# Altium integrated library Mastermind.IntLib: 985 symbols (part 2 of 6) (continued)
## Header 5X2_TE-CON (continued)
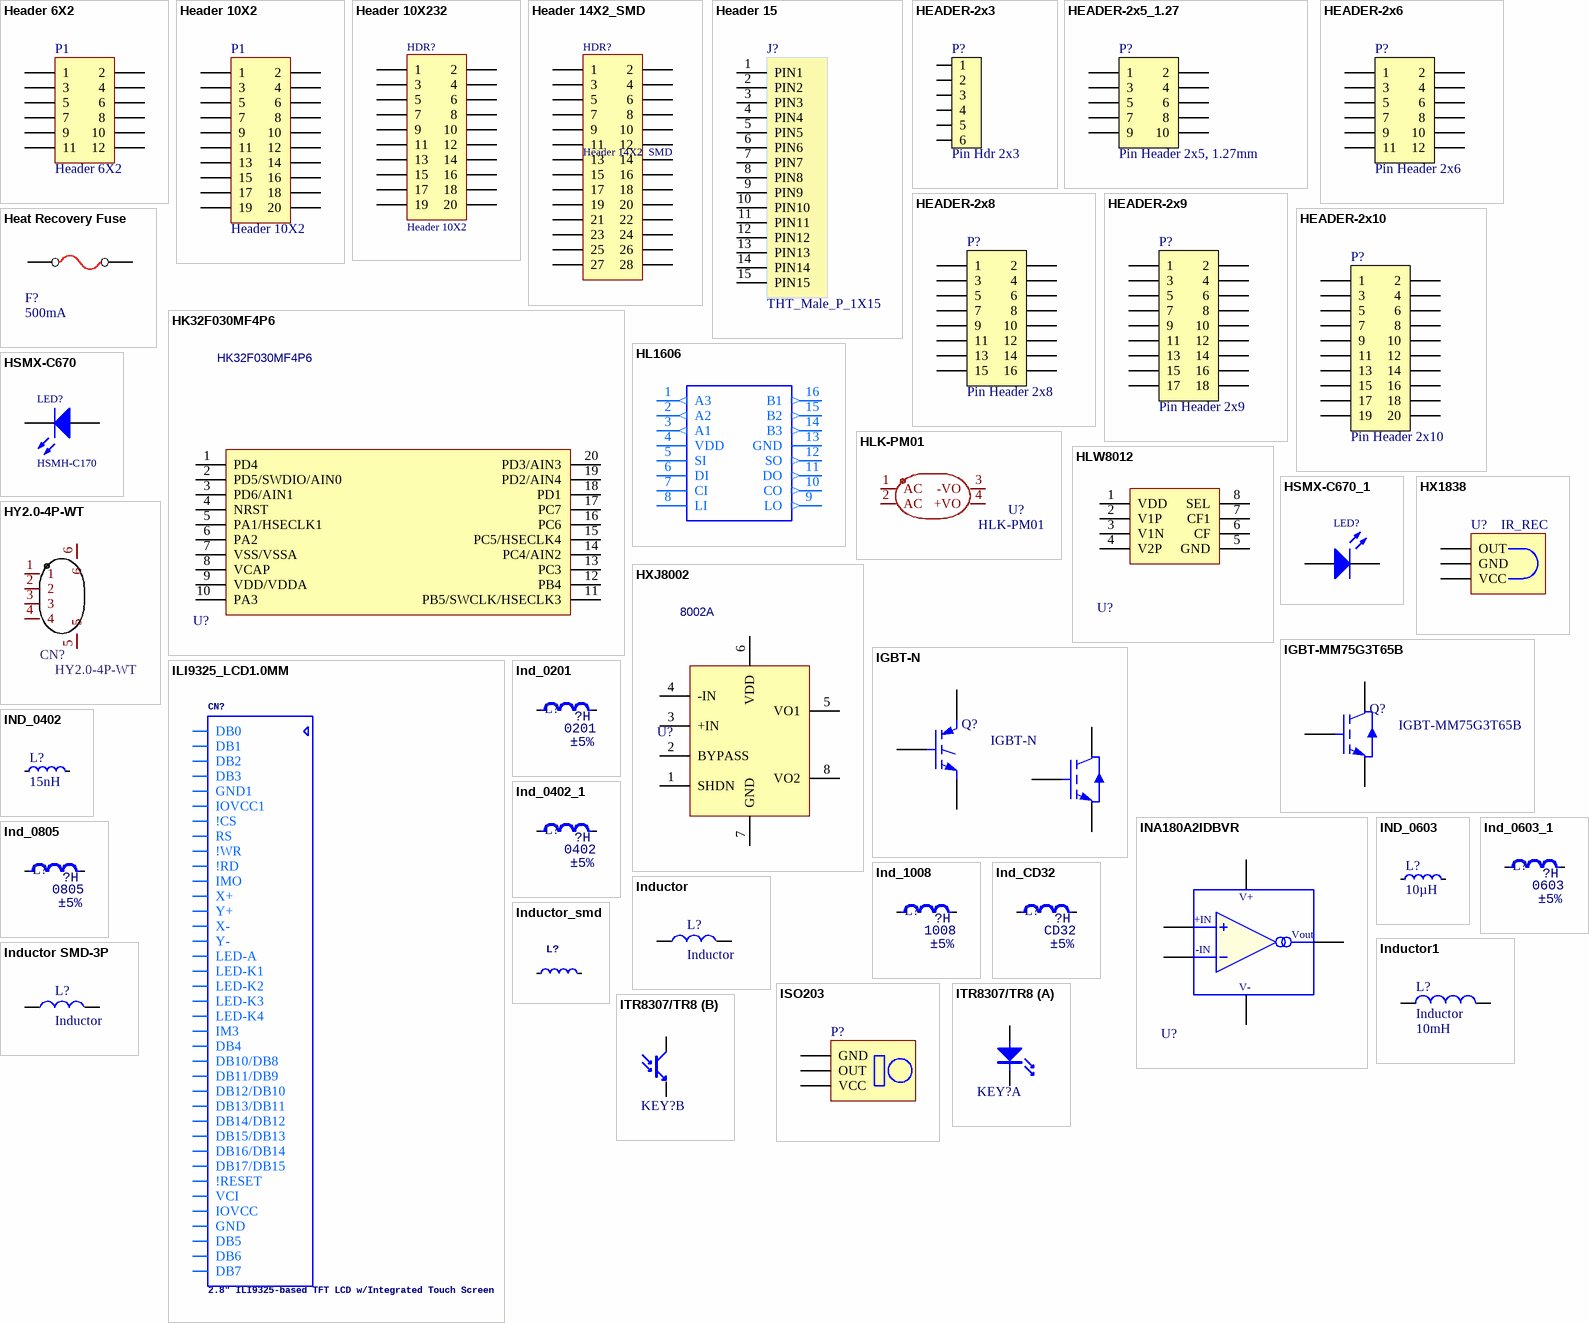
[diagram p14: symbols Header 6X2 to ITR8307/TR8]

## Header 6X2
designator P1
Header, 6-Pin, Dual row; LatestRevisionDate: 17-Jul-2002; LatestRevisionNote: Re-released for DXP Platform.; Publisher: Altium Limited
footprint HDR2X6 (Connector; Header; 6x2 Position)
signal-integrity model Connector
footprint DIP12_2sided
footprint HDR_2x6 - SMD - 2.0
footprint HDR_2x6 - SMD - 2.54
footprint HDR2X6_2mm (Connector; Header; 6x2 Position)
pins: 1, 2, 3, 4, 5, 6, 7, 8, 9, 10, 11, 12

## Header 10X2
designator P1
Header, 10-Pin, Dual row; LatestRevisionDate: 17-Jul-2002; LatestRevisionNote: Re-released for DXP Platform.; Publisher: Altium Limited
footprint HDR2X10
signal-integrity model Connector
pins: 1, 2, 3, 4, 5, 6, 7, 8, 9, 10, 11, 12, 13, 14, 15, 16, 17, 18, 19, 20

## Header 10X232
designator HDR?, comment Header 10X2
Header, 10-Pin, Dual row; Revision: July-2002: Re-released for DXP Platform.
footprint HDR2X10
signal-integrity model Connector
3D model HDR10X2 (PCB3D Model)
pins: 1, 2, 3, 4, 5, 6, 7, 8, 9, 10, 11, 12, 13, 14, 15, 16, 17, 18, 19, 20

## Header 14X2_SMD
designator HDR?, comment Header 14X2  SMD
Header, 5-Pin, Dual row; Revision: 17-Jul-2002: Re-released for DXP Platform.
signal-integrity model Connector
3D model 10_pin_box_male (PCB3D Model)
footprint DIP28_2SIDED
pins: 1, 2, 3, 4, 5, 6, 7, 8, 9, 10, 11, 12, 13, 14, 15, 16, 17, 18, 19, 20, 21, 22, 23, 24, 25, 26, 27, 28

## Header 15
designator J?  Name: THT_Male_P_1X15
Header, 15-Pin; LatestRevisionDate: 17-Jul-2002; LatestRevisionNote: Re-released for DXP Platform.; Publisher: Altium Limited
footprint HDR1X15 (Connector; Header; 15 Position)
signal-integrity model Connector
pins: 1 PIN1, 2 PIN2, 3 PIN3, 4 PIN4, 5 PIN5, 6 PIN6, 7 PIN7, 8 PIN8, 9 PIN9, 10 PIN10, 11 PIN11, 12 PIN12, 13 PIN13, 14 PIN14, 15 PIN15

## HEADER-2x3
designator P?, comment Pin Hdr 2x3
Pin Header 2x3, 2.54mm (100mil) SMD; Part Number: Pin Header 2x3 SMD; Manufacturer: WCON; Manufacturer Part Number: 1125-1203S0M116R1; 2nd source part number: TSM-103-01-L-DV; Artikkelnr Noca: 55010007; Artikkelnr Simpro: N.A.; Datasheet: \\hizz\pro\app9717\Datasheet\connectores\W-CON\1125-12XXXXMXXXXX.PDF; Footprint Doc: HDR_2x3-SMD; LatestRevisionDate: 2016-01-22; Pin Count: 6; Publisher: Nordic Semiconductor; Published: 2016-01-22; Value: Pin Hdr 2x3; Note: SMD; Supplier: Cabcon; Supplier part number: 1125-1203S0M116R1; 2nd source Supplier: Samtec
footprint HDR_2x3-SMD
pins: 1, 2, 3, 4, 5, 6

## HEADER-2x5_1.27
designator P?, comment Pin Header 2x5, 1.27mm
Pin Header 2x5, 1.27mm (50mil), SMD, Keying Shroud; Part Number: Pin Header 2x5 SMD, 1.27mm, KS; Manufacturer: WCON; Manufacturer Part Number: 3132-10MS0BK00R1; 2nd source part number: FTSH-105-01-F-DV-K; Artikkelnr Noca: 55010009; Artikkelnr Simpro: N.A.; Datasheet: \\hizz\pro\app9717\Datasheet\connectores\W-CON\3132-XXMXXBK00XX.pdf; Footprint Doc: HDR_2x5-SMD-1.27mm; LatestRevisionDate: 2016-04-21; Pin Count: 10; Publisher: Nordic Semiconductor; Published: 2016-01-22; Value: Pin Header 2x5, 1.27mm; Note: *; Supplier: Cabcon; Supplier part number: 3132-10MS0BK00R1; 2nd source Supplier: Samtec
footprint HDR_2x5-SMD-1.27mm-K
pins: 1, 2, 3, 4, 5, 6, 7, 8, 9, 10

## HEADER-2x6
designator P?, comment Pin Header 2x6
Pin Header 2x6, 2.54mm (100mil); Note: Not mounted; Artikkelnr Noca: N.A.; Part Number: Pin Header 2x6; Manufacturer: *; Manufacturer Part Number: *; Datasheet: *; Footprint Doc: HDR_2x6; LatestRevisionDate: 2014-07-04; Pin Count: 12; Publisher: Nordic Semiconductor; Published: 2009-12-12; Value: Pin Header 2x6; Supplier: *; Supplier part number: *; 2nd source Supplier: *; 2nd source part number: *; Artikkelnr Simpro: N.A.
footprint HDR_2x6
pins: 1, 2, 3, 4, 5, 6, 7, 8, 9, 10, 11, 12

## HEADER-2x8
designator P?, comment Pin Header 2x8
Pin Header 2x8, 2.54mm (100mil); Note: Not mounted; Artikkelnr Noca: N.A.; Part Number: Pin Header 2x8; Manufacturer: *; Manufacturer Part Number: *; Datasheet: *; Footprint Doc: HDR_2x8; LatestRevisionDate: 2009-12-12; Pin Count: 16; Publisher: Nordic Semiconductor; Published: 2009-12-12; Value: Pin Header 2x8; Supplier: *; Supplier part number: *; 2nd source Supplier: *; 2nd source part number: *; Artikkelnr Simpro: N.A.
footprint HDR_2x8
pins: 1, 2, 3, 4, 5, 6, 7, 8, 9, 10, 11, 12, 13, 14, 15, 16

## HEADER-2x9
designator P?, comment Pin Header 2x9
Pin Header 2x9, 2.54mm (100mil); Artikkelnr Noca: N.A.; Part Number: Pin Header 2x9; Manufacturer: *; Manufacturer Part Number: *; Datasheet: *; Footprint Doc: HDR_2x9; LatestRevisionDate: 2011-07-06; Pin Count: 18; Publisher: Nordic Semiconductor; Published: 2011-07-06; Value: Pin Header 2x9; Note: *; Supplier: *; Supplier part number: *; 2nd source Supplier: *; 2nd source part number: *; Artikkelnr Simpro: N.A.
footprint HDR_2x9
pins: 1, 2, 3, 4, 5, 6, 7, 8, 9, 10, 11, 12, 13, 14, 15, 16, 17, 18

## HEADER-2x10
designator P?, comment Pin Header 2x10
Pin Header 2x10, 2.54mm (100mil); Note: Not mounted; Artikkelnr Noca: N.A.; Part Number: Pin Header 2x10; Manufacturer: *; Manufacturer Part Number: *; Datasheet: *; Footprint Doc: HDR_2x10; LatestRevisionDate: 2014-07-04; Pin Count: 20; Publisher: Nordic Semiconductor; Published: 2009-12-12; Value: Pin Header 2x10; Supplier: *; Supplier part number: *; 2nd source Supplier: *; 2nd source part number: *; Artikkelnr Simpro: N.A.
footprint HDR_2x10
pins: 1, 2, 3, 4, 5, 6, 7, 8, 9, 10, 11, 12, 13, 14, 15, 16, 17, 18, 19, 20

## Heat Recovery Fuse
designator F?  value 500mA
footprint 0411V
footprint FUSE
footprint FUSE - Long
footprint 0207/2V
footprint Fuse-SMD
footprint 1812
footprint R1206-NO
pins: 1, 2

## HK32F030MF4P6
designator U?
Manufacturer: HK(航顺); Contributor: LCSC; Supplier: LCSC; Supplier Part: C707444; Manufacturer Part: HK32F030MF4P6; JLCPCB Part Class: Extended Part; spicePre: U; spiceSymbolName: HK32F030MF4P6
footprint TSSOP-20_L6.5-W4.4-P0.65-LS6.4-BL
pins: 1 PD4, 2 PD5/SWDIO/AIN0, 3 PD6/AIN1, 4 NRST, 5 PA1/HSECLK1, 6 PA2, 7 VSS/VSSA, 8 VCAP, 9 VDD/VDDA, 10 PA3, 11 PB5/SWCLK/HSECLK3, 12 PB4, 13 PC3, 14 PC4/AIN2, 15 PC5/HSECLK4, 16 PC6, 17 PC7, 18 PD1, 19 PD2/AIN4, 20 PD3/AIN3

## HL1606
designator ?
footprint SO16
pins: 1 A3 (out), 2 A2 (out), 3 A1 (out), 4 VDD (power), 5 SI, 6 DI, 7 CI, 8 LI, 9 LO (out), 10 CO (out), 11 DO (out), 12 SO (out), 13 GND (power), 14 B3 (out), 15 B2 (out), 16 B1 (out)

## HLK-PM01
designator U?
Manufacturer: HI-LINK(海凌科); Add into BOM: yes; Symbol: HLK-PM01; Device: HLK-PM01; LCSC Part Name: HLK-PM01; Supplier Part: C209903; Manufacturer Part: HLK-PM01; Supplier Footprint: 插件; JLCPCB Part Class: Extended Part; Datasheet: https://atta.szlcsc.com/upload/public/pdf/source/20220421/8C2E290B3E1C64DAE99DB0B33492E42C.pdf; Supplier: LCSC; Convert to PCB: yes
footprint PWRM-TH_HLK-PM01
pins: 1 AC, 2 AC, 3 -VO, 4 +VO

## HLW8012
designator U?
footprint SOP8
pins: 1 VDD (power), 2 V1P, 3 V1N, 4 V2P, 5 GND, 6 CF, 7 CF1, 8 SEL (power)

## HSMX-C670
designator LED?, comment HSMH-C170
Typical RED GaAs SMD LED Agilent make; AEMS Code: 2610081; Revision: July-2002: Re-released for DXP Platform.
footprint SMD _LED
simulation model LED1 (Diode)
3D model LED (PCB3D Model)
pins: 1 A, 2 K

## HSMX-C670_1
designator LED?, comment HSMH-C170  (value not drawn)
Typical RED GaAs SMD LED Agilent make; AEMS Code: 2610081; Revision: July-2002: Re-released for DXP Platform.
footprint SMD _LED
simulation model LED1 (Diode)
3D model LED (PCB3D Model)
pins: 1 A, 2 K

## HX1838
designator U?
Header, 3-Pin; LatestRevisionDate: 17-Jul-2002; LatestRevisionNote: Re-released for DXP Platform.; Publisher: Altium Limited
footprint ISO203 (Connector; Header; 3 Position)
pins: 1 OUT, 2 GND, 3 VCC
text: IR_REC

## HXJ8002
designator U?, comment 8002A
Manufacturer: IDCHIP(英锐芯); Contributor: LCSC; Supplier: LCSC; Supplier Part: C329448; Manufacturer Part: 8002A; JLCPCB Part Class: Extended Part; spicePre: U; spiceSymbolName: 8002A
footprint SOIC-8E (SOIC, 8-Leads, Body 4.90x3.90mm, Pitch 1.27mm, IPC Medium Density)
pins: 1 SHDN, 2 BYPASS, 3 +IN, 4 -IN, 5 VO1, 6 VDD, 7 GND, 8 VO2

## HY2.0-4P-WT
designator CN?
Manufacturer: CAX(创都); Add into BOM: yes; Pins Structure: 1x4P; Pitch: 2mm; Number of PINs Per Row: 4; Symbol: HY2.0-4P-WT; Device: HY2.0-4P-WT; Supplier: LCSC; Supplier Part: C722729; Manufacturer Part: HY2.0-4P-WT; JLCPCB Part Class: Extended Part; LCSC Part Name: 1x4P 间距:2mm 卧贴; Supplier Footprint: SMD,P=2mm,卧贴; Datasheet: https://atta.szlcsc.com/upload/public/pdf/source/20200903/C722727_BBF50559C2ABBA609D4F52DD7C381BF6.pdf; Convert to PCB: yes; Mounting Style: 卧贴; Reference Series: -; Number of Pins: 4P; Number of Rows: 1; Row Spacing: -; Current Rating (Max): -; Operating Temperature Range: -
footprint CONN-SMD_HY2.0-4P
pins: 1, 2, 3, 4, 5, 6

## IGBT-MM75G3T65B
designator Q?
N-Channel  650V 75A; Published: 8-Jun-2000; LatestRevisionDate: 17-Jul-2002; LatestRevisionNote: Re-released for DXP Platform.; DatasheetVersion: PD-9.684A; PackageReference: TO-247; Publisher: Altium Limited; PackageDescription: SIP with Mounting Hole; 3 Leads; Body 20 x 15.6 x 5 mm (typ); Pitch 5.45 mm; Code_JEDEC: TO-247-AC; ComponentLink1Description: Manufacturer Link; ComponentLink1URL: http://www.irf.com/
footprint TO-247 (SIP with Mounting Hole; 3 Leads; Body 20 x 15.6 x 5 mm (typ); Pitch 5.45 mm)
pins: 1 G, 2 C, 3 E

## IGBT-N
designator Q?
Insulated Gate Bipolar Transistor (N-Channel); Published: 8-Jun-2000; LatestRevisionDate: 17-Jul-2002; LatestRevisionNote: Re-released for DXP Platform.; DatasheetVersion: PD-9.684A; PackageReference: TO-247; Publisher: Altium Limited; PackageDescription: SIP with Mounting Hole; 3 Leads; Body 20 x 15.6 x 5 mm (typ); Pitch 5.45 mm; Code_JEDEC: TO-247-AC; ComponentLink1Description: Manufacturer Link; ComponentLink1URL: http://www.irf.com/
pins: 1 G, 1 G, 2 C, 2 C, 3 E, 3 E

## ILI9325_LCD1.0MM
designator CN?, comment 2.8" ILI9325-based TFT LCD w/Integrated Touch Screen
footprint ILI9325_28INCH_TS
pins: 1 DB0, 2 DB1, 3 DB2, 4 DB3, 5 GND1 (power), 6 IOVCC1 (power), 7 !CS, 8 RS, 9 !WR, 10 !RD, 11 IMO, 12 X+, 13 Y+, 14 X-, 15 Y-, 16 LED-A, 17 LED-K1, 18 LED-K2, 19 LED-K3, 20 LED-K4, 21 IM3, 22 DB4, 23 DB10/DB8, 24 DB11/DB9, 25 DB12/DB10, 26 DB13/DB11, 27 DB14/DB12, 28 DB15/DB13, 29 DB16/DB14, 30 DB17/DB15, 31 !RESET, 32 VCI (power), 33 IOVCC (power), 34 GND (power), 35 DB5, 36 DB6, 37 DB7

## INA180A2IDBVR
designator U?, comment Shunt Current  (value not drawn)
footprint SOT23-6
pins: 1 OA, 2 GND, 3 A+, 4 A-, 5 VCC
text: V+; +IN; Vout; -IN; V-

## Ind_0201
designator L?, comment value ?H  Note: ±5%  Type: 0201  (hidden comment: H0201)
Inductor; Specification: High frequency chip inductor ±5%; Manufacturer: *
footprint IND_0201
pins: 1, 2

## IND_0402
designator L?, comment 15nH
Inductor, 320mA, ±5%; Part Number: L0402-15n; Manufacturer: Taiyo Yuden; Manufacturer Part Number: HK100515NJ-T; 2nd source part number: 658-1328; Note: High frequency chip inductor ±10%; Artikkelnr Noca: 33029323; Artikkelnr Simpro: N.A.; LatestRevisionDate: 2012-09-19; Pin Count: 2; Publisher: Nordic Semiconductor; Published: 2010-07-12; Value: 15nH; Supplier: Digi-Key; Datasheet: http://www.yuden.co.jp/productdata/catalog/en/mlci04_e.pdf; Supplier part number: 587-1521-1-ND; 2nd source Supplier: Farnell; Footprint Doc: 0402
footprint INDC1005X04L
pins: 1, 2

## Ind_0402_1
designator L?, comment value ?H  Note: ±5%  Type: 0402  (hidden comment: H0402)
Inductor; Specification: High frequency chip inductor ±5%; Manufacturer: *
footprint IND_0402
pins: 1, 2

## IND_0603
designator L?, comment 10µH
Inductor, 80mA, ±10%; Part Number: L0603-10µ; Manufacturer: Taiyo Yuden; Manufacturer Part Number: LBMF1608T100K; 2nd source part number: 178-6105; Note: LBMF1608T100K 10µH 80mA 0603; Artikkelnr Noca: 33029314; Artikkelnr Simpro: N.A.; Datasheet: http://www.yuden.co.jp/ut/product/pdf/elb2_e.pdf; LatestRevisionDate: 2012-09-19; Pin Count: 2; Publisher: Nordic Semiconductor; Published: 2010-02-24; Value: 10µH; Supplier: Digi-Key; Supplier part number: 587-1714-1-ND; 2nd source Supplier: Farnell; Footprint Doc: 0603
footprint INDC1608X06L
pins: 1, 2

## Ind_0603_1
designator L?, comment value ?H  Note: ±5%  Type: 0603  (hidden comment: H0603)
Inductor; Specification: High frequency chip inductor ±5%; Manufacturer: *
footprint IND_0603
pins: 1, 2

## Ind_0805
designator L?, comment value ?H  Note: ±5%  Type: 0805  (hidden comment: H0805)
Inductor; Specification: High frequency chip inductor ±5%; Manufacturer: *
footprint IND_0805
pins: 1, 2

## Ind_1008
designator L?, comment value ?H  Note: ±5%  Type: 1008  (hidden comment: H1008)
Inductor; Specification: High frequency chip inductor ±5%; Manufacturer: *
footprint IND_1008
pins: 1, 2

## Ind_CD32
designator L?, comment value ?H  Note: ±5%  (hidden comment: CD32)
Power Inductor; Specification: High frequency chip inductor ±5%; Manufacturer: *; Type: CD32
footprint IND_CD32
pins: 1, 2

## Inductor
designator L?
footprint I1206K - Inductor
footprint 82114R
footprint 0207/2V
footprint INDUCTOR_4X4MM_SMD
footprint INDUCTOR_7X7MM_SMD
footprint INDUCTOR_10X10MM_SMD - duplicate
footprint IND-SMD_L6.0-W6.0
footprint IND-SMD_L12.3-W12.3
footprint IND-SMD_L4.0-W4.0_SMNR4020
footprint TORIDAL-D27_W13
footprint TORIDAL-L48_W34
footprint TORIDAL-L66_W50
footprint SM5845
pins: 1, 2

## Inductor1
designator L?, comment Inductor  value 10mH
Code_IEC: 1005; Published: 8-Jun-2000; LatestRevisionDate: 29-May-2009; LatestRevisionNote: IPC-7351 Footprint Added.; PackageReference: 0402-A; Publisher: Altium Limited; PackageDescription: Chip Inductor; Code_JEITA: 0402
footprint 0402-A (Chip Inductor, Body 1.0x0.5mm, IPC High Density)
footprint INDC1608L (Chip Inductor, Body 1.6x0.8mm, IPC High Density)
footprint 2029 (Chip Inductor, Body 2.0x1.2mm, IPC High Density)
footprint 0603 (Chip Inductor, Body 0.6x0.3mm, IPC High Density)
footprint INDC3216 (Chip Inductor, Body 3.2x1.6mm, IPC High Density)
footprint INDC4532 (Chip Inductor, Body 4.5x3.2mm, IPC High Density)
simulation model INDUCTOR (Inductor)
signal-integrity model Inductor
pins: 1, 2

## Inductor SMD-3P
designator L?, comment Inductor
SMD-3P, Power Inductors ROHS
footprint IND-SMD_3P-L12.7-W12.5
footprint IND-SMD_3P-L27.9-W19.7-P10.43-LS27.9-BL-A
pins: 1, 2, 3 GND hidden to GND

## Inductor_smd
designator L?, comment Chip inductor  (value not drawn)
footprint INDC-0603
pins: 1, 2

## ISO203
designator P?
Header, 3-Pin; LatestRevisionDate: 17-Jul-2002; LatestRevisionNote: Re-released for DXP Platform.; Publisher: Altium Limited
footprint ISO203 (Connector; Header; 3 Position)
pins: 1 GND, 2 OUT, 3 VCC

## ITR8307/TR8
designator KEY?  (value not drawn)
Manufacturer: EVERLIGHT(亿光); Supplier: LCSC; Manufacturer Part: ITR8307/TR8; Supplier Part: C67922; JLCPCB Part Class: Extended Part; spicePre: K; spiceSymbolName: ITR8307/TR8
footprint OPTO-4P-L3.4-W2.7-P1.30-LS4.6
part A pins: 1 K "Cathode", 2 A "Anode"
part B pins: 3 C "Collector", 4 E "Emitter"

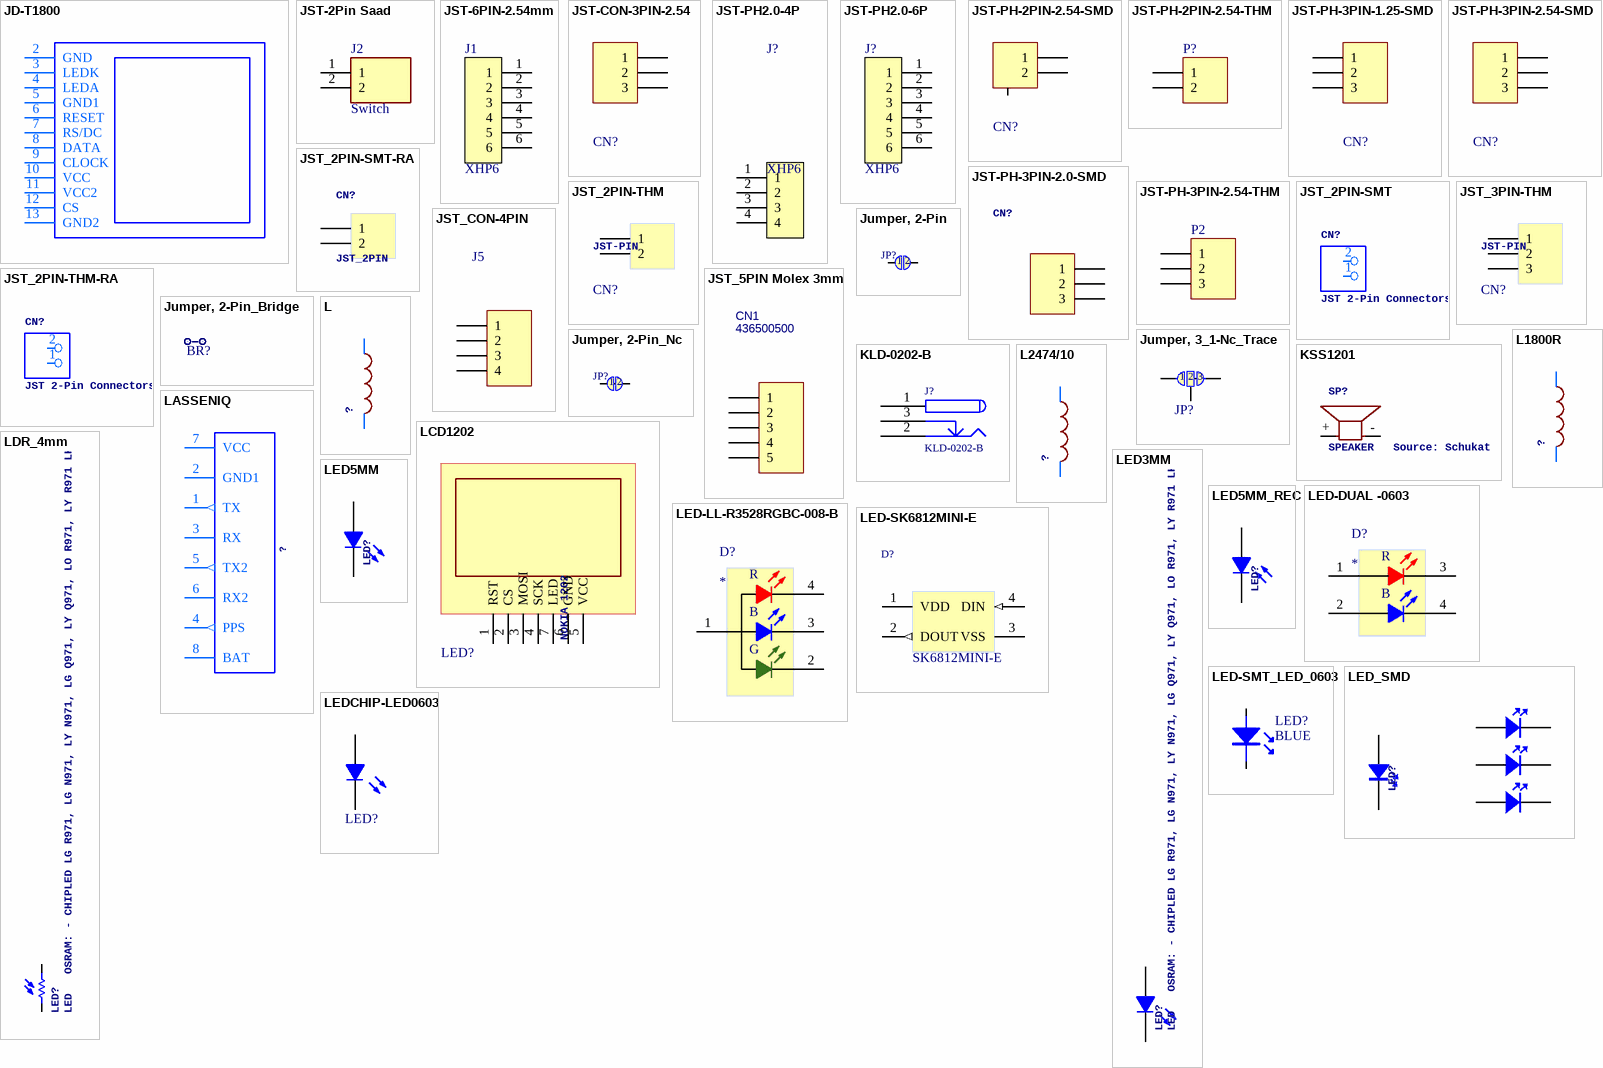
[diagram p15: symbols JD-T1800 to LEDCHIP-LED0603]

## JD-T1800
designator LCD?
footprint JD-T1800
pins: 2 GND (power), 3 LEDK, 4 LEDA, 5 GND1 (power), 6 RESET, 7 RS/DC, 8 DATA, 9 CLOCK, 10 VCC (power), 11 VCC2 (power), 12 CS, 13 GND2 (power)

## JST-2Pin Saad
designator J2, comment Switch
Connector Header Through Hole 2 position 0.098 (2.50mm); DETAILS: Connector Header Through Hole 2 position 0.098" (2.50mm); MFG: JST Sales America Inc.; MFGPN: B2B-XH-A(LF)(SN); PACKAGE: CONN HEADER VERT 2POS 2.5MM; URL: https://www.digikey.com/en/products/detail/jst-sales-america-inc/B2B-XH-A-LF-SN/1651045?s=N4IgTCBcDaIEJjgWgBoAkkEEAUAZAYgJTYDKAcoSALoC%2BQA
footprint JST_B2B-XH-A(LF)(SN)
pins: 1, 2

## JST-6PIN-2.54mm
designator J1, comment XHP6
footprint JST_B6B-XH-A(LF)(SN)
pins: 1, 2, 3, 4, 5, 6

## JST-CON-3PIN-2.54
designator CN?, comment ZX-XH2.54-3PWT  (value not drawn)
Manufacturer: Megastar(兆星); Contributor: lcsc; Supplier: LCSC; Supplier Part: C7429672; Manufacturer Part: ZX-XH2.54-3PWT; JLCPCB Part Class: Extended Part; spicePre: C; spiceSymbolName: ZX-XH2.54-3PWT
footprint JST_B3B-XH-A(LF)(SN)
pins: 1, 2, 3

## JST-PH2.0-4P
designator J?, comment XHP6
footprint JST-PH2.0-4PINS
pins: 1, 2, 3, 4

## JST-PH2.0-6P
designator J?, comment XHP6
footprint JST-PH2.0-6PINS
pins: 1, 2, 3, 4, 5, 6

## JST-PH-2PIN-2.54-SMD
designator CN?, comment ZX-XH2.54-2PWT  (value not drawn)
Manufacturer: Megastar(兆星); Contributor: lcsc; Supplier: LCSC; Supplier Part: C7429671; Manufacturer Part: ZX-XH2.54-2PWT; JLCPCB Part Class: Extended Part; spicePre: C; spiceSymbolName: ZX-XH2.54-2PWT
footprint CONN-SMD_2P-P2.54_MEGASTAR_ZX-XH2.54-2PWT
pins: 1, 2, M

## JST-PH-2PIN-2.54-THM
designator P?, comment Header 2  (value not drawn)
Header, 2-Pin; LatestRevisionDate: 17-Jul-2002; LatestRevisionNote: Re-released for DXP Platform.; Publisher: Altium Limited
footprint JST-PH-2PIN-2.54-THM
pins: 1, 2

## JST-PH-3PIN-1.25-SMD
designator CN?, comment ZX-XH2.54-3PWT  (value not drawn)
Manufacturer: Megastar(兆星); Contributor: lcsc; Supplier: LCSC; Supplier Part: C7429672; Manufacturer Part: ZX-XH2.54-3PWT; JLCPCB Part Class: Extended Part; spicePre: C; spiceSymbolName: ZX-XH2.54-3PWT
footprint CONN-TH_SM03B-GHS-TB-LF-SN
pins: 1, 2, 3, 4 GND hidden to GND, 5 GND hidden to GND

## JST-PH-3PIN-2.0-SMD
designator CN?
footprint JSTPH3
pins: 1, 2, 3

## JST-PH-3PIN-2.54-SMD
designator CN?, comment ZX-XH2.54-3PWT  (value not drawn)
Manufacturer: Megastar(兆星); Contributor: lcsc; Supplier: LCSC; Supplier Part: C7429672; Manufacturer Part: ZX-XH2.54-3PWT; JLCPCB Part Class: Extended Part; spicePre: C; spiceSymbolName: ZX-XH2.54-3PWT
footprint CONN-SMD_3P-P2.54-XH2.54-WT
pins: 1, 2, 3, M GND hidden

## JST-PH-3PIN-2.54-THM
designator P2, comment Header 3  (value not drawn)
Header, 3-Pin; LatestRevisionDate: 17-Jul-2002; LatestRevisionNote: Re-released for DXP Platform.; Publisher: Altium Limited
footprint JST-PH-3PIN-2.54-THM
pins: 1, 2, 3

## JST_2PIN-SMT
designator CN?, comment JST 2-Pin Connectors of various flavors SMT-RA (S2B-PH-SM4) 4UConnector #17311  SMT  (B2B-PH-SM4)  THM-RA (S2B-PH)  THM  (B2B-PH)
footprint JST-PH-2-SMT
pins: 1 2, 2 1

## JST_2PIN-SMT-RA
designator CN?, comment JST_2PIN
JST 2-Pin Connectors of various flavors SMT-RA (S2B-PH-SM4) 4UConnector #17311  SMT  (B2B-PH-SM4)  THM-RA (S2B-PH)  THM  (B2B-PH)
footprint JST-PH-2-SMT-RA
pins: 1, 2

## JST_2PIN-THM
designator CN?, comment JST-PIN
footprint JST-2-PTH-THM - VERTICAL
pins: 1, 2

## JST_2PIN-THM-RA
designator CN?, comment JST 2-Pin Connectors of various flavors SMT-RA (S2B-PH-SM4) 4UConnector #17311  SMT  (B2B-PH-SM4)  THM-RA (S2B-PH)  THM  (B2B-PH)
footprint JST-PH-2-THM-RA
pins: 1 2, 2 1

## JST_3PIN-THM
designator CN?, comment JST-PIN
footprint JST-3-PTH-THM - VERTICAL
pins: 1, 2, 3

## JST_5PIN Molex 3mm
designator CN1, comment 436500500
BOM_Manufacturer: MOLEX; Contributor: LCSC; BOM_Supplier: LCSC; BOM_Supplier Part: C492351; BOM_Manufacturer Part: 436500500; BOM_JLCPCB Part Class: Extended Part; spicePre: C; spiceSymbolName: 436500500
footprint CONN-TH_436500500
pins: 1, 2, 3, 4, 5

## JST_CON-4PIN
designator J5
4 Position Wire to Board Terminal Block Horizontal with Board 0.100 _2.54mm_ Through Hole; DETAILS: Connector Header Through Hole 4 position 0.098" (2.50mm); MFG: JST Sales America Inc.; MFGPN: B4B-XH-A(LF)(SN); PACKAGE: 4POS 2.5MM; URL: https://www.digikey.com/en/products/detail/jst-sales-america-inc/B4B-XH-A-LF-SN/1651047
footprint JST_B4B-XH-A(LF)(SN)
pins: 1, 2, 3, 4

## Jumper, 2-Pin
designator JP?, comment GND  (value not drawn)  (no BOM)
Jumper, 2-Pin
footprint JUMPER-SB
footprint Jumper-NO
footprint SB_0603 (Jumper)
pins: 1, 2